# Altium footprint library Capacitors.PcbLib: 93 footprints (part 5 of 6)
Each footprint in its own frame and in the unit in brackets; x right, y up, seen from the top. Pads: shape width x height; smd on the part's side, far side on the other; paste and mask are expansions set on the pad; w line width, h text height; cw(c..) or ccw(c..) is an arc to the next point about the centre after c.
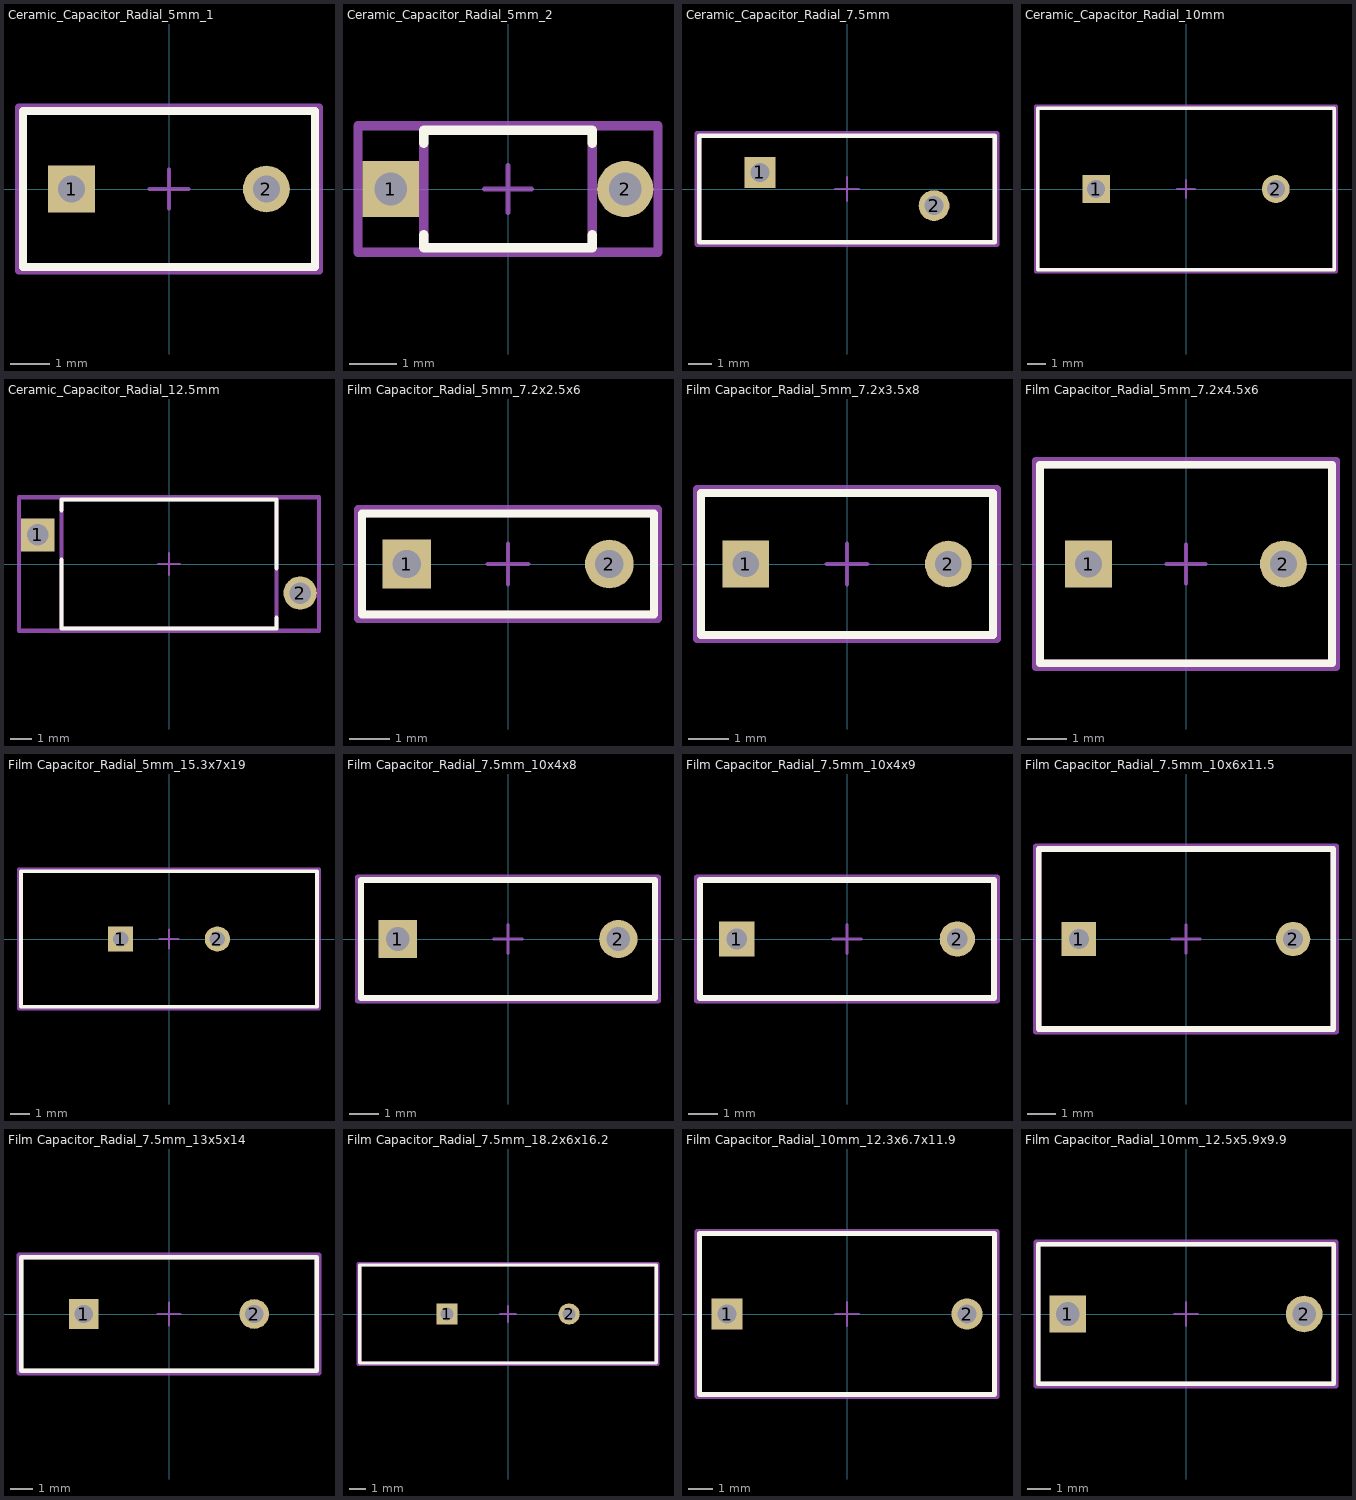
[diagram p4: the footprints below, top view; thin cyan lines are the x and y axes]

## Ceramic_Capacitor_Radial_5mm_1 [mm]
pads (2):
  rect 1.2x1.2 hole 0.7 paste-2539.97 mask+0: 1(-2.5,0)
  round 1.2 hole 0.7 paste-2539.97 mask+0: 2(2.5,0)
Top Overlay:
  lines w0.2: -3.75,-2 3.75,-2 3.75,2 -3.75,2 -3.75,-2
Top Assembly:
  lines w0.2: -3.85,-2.1 3.85,-2.1 3.85,2.1 -3.85,2.1 -3.85,-2.1
Top 3D Body:
  lines w0.2: -3.75,-2 3.75,-2 3.75,2 -3.75,2 -3.75,-2
Top Courtyard:
  lines w0.2: -3.85,-2.1 3.85,-2.1 3.85,2.1 -3.85,2.1 -3.85,-2.1
Top Component Center:
  lines w0.1: -0.5,0 0.5,0 ; 0,-0.5 0,0.5
3D body "Cap_Murata_RDE7U2J333J5B1H03B_eec.STEP": height 0.25, standoff 0, extent -3.85,-2.1 3.85,2.1

## Ceramic_Capacitor_Radial_5mm_2 [mm]
pads (2):
  rect 1.2x1.2 hole 0.7 paste-2539.97 mask+0: 1(-2.5,0)
  round 1.2 hole 0.7 paste-2539.97 mask+0: 2(2.5,0)
Top Overlay:
  lines w0.2: -1.8,-0.975 -1.8,-1.25 1.8,-1.25 1.8,-0.975 ; -1.8,0.975 -1.8,1.25 1.8,1.25 1.8,0.975
Top Assembly:
  lines w0.2: -3.2,-1.35 3.2,-1.35 3.2,1.35 -3.2,1.35 -3.2,-1.35
Top 3D Body:
  lines w0.2: -1.8,-1.25 1.8,-1.25 1.8,1.25 -1.8,1.25 -1.8,-1.25
Top Courtyard:
  lines w0.2: -3.2,-1.35 3.2,-1.35 3.2,1.35 -3.2,1.35 -3.2,-1.35
Top Component Center:
  lines w0.1: -0.5,0 0.5,0 ; 0,-0.5 0,0.5
3D body "Cap_Murata_RCE5C2A3R0C0K1H03B_eec.STEP": height 0.25, standoff 0, extent -3.2,-1.35 3.2,1.35

## Ceramic_Capacitor_Radial_7.5mm [mm]
pads (2):
  rect 1.3x1.3 hole 0.8 paste-2539.97 mask+0: 1(-3.684,0.7)
  round 1.3 hole 0.8 paste-2539.97 mask+0: 2(3.684,-0.7)
Top Overlay:
  lines w0.2: -6.25,-2.25 -6.25,2.25 6.25,2.25 6.25,-2.25 -6.25,-2.25
Top Assembly:
  lines w0.2: -6.35,-2.35 -6.35,2.35 6.35,2.35 6.35,-2.35 -6.35,-2.35
Top 3D Body:
  lines w0.2: -6.25,-2.25 -6.25,2.25 6.25,2.25 6.25,-2.25 -6.25,-2.25
Top Courtyard:
  lines w0.2: -6.35,-2.35 -6.35,2.35 6.35,2.35 6.35,-2.35 -6.35,-2.35
Top Component Center:
  lines w0.1: -0.5,0 0.5,0 ; 0,-0.5 0,0.5
3D body "Cap_Vishay_WYO472MCMCF0KR_eec.STEP": height 0.25, standoff 0, extent -6.35,-2.35 6.35,2.35

## Ceramic_Capacitor_Radial_10mm [mm]
pads (2):
  rect 1.55x1.55 hole 1 paste-2539.97 mask+0: 1(-5,0)
  round 1.55 hole 1 paste-2539.97 mask+0: 2(5,0)
Top Overlay:
  lines w0.2: -8.25,-4.5 8.25,-4.5 8.25,4.5 -8.25,4.5 -8.25,-4.5
Top Assembly:
  lines w0.2: -8.35,-4.6 8.35,-4.6 8.35,4.6 -8.35,4.6 -8.35,-4.6
Top 3D Body:
  lines w0.2: -8.25,-4.5 8.25,-4.5 8.25,4.5 -8.25,4.5 -8.25,-4.5
Top Courtyard:
  lines w0.2: -8.35,-4.6 8.35,-4.6 8.35,4.6 -8.35,4.6 -8.35,-4.6
Top Component Center:
  lines w0.1: -0.5,0 0.5,0 ; 0,-0.5 0,0.5
3D body "Cap_Panasonic_ECKD4A102MDU_eec.STEP": height 0.25, standoff 0, extent -8.35,-4.6 8.35,4.6

## Ceramic_Capacitor_Radial_12.5mm [mm]
pads (2):
  rect 1.55x1.55 hole 1 paste-2539.97 mask+0: 1(-6.102,1.35)
  round 1.55 hole 1 paste-2539.97 mask+0: 2(6.102,-1.35)
Top Overlay:
  lines w0.2: -5,0.2 -5,-3 5,-3 5,-2.5 ; -5,2.5 -5,3 5,3 5,-0.2
Top Assembly:
  lines w0.2: -6.977,-3.1 6.977,-3.1 6.977,3.1 -6.977,3.1 -6.977,-3.1
Top 3D Body:
  lines w0.2: -5,-3 5,-3 5,3 -5,3 -5,-3
Top Courtyard:
  lines w0.2: -6.977,-3.1 6.977,-3.1 6.977,3.1 -6.977,3.1 -6.977,-3.1
Top Component Center:
  lines w0.1: -0.5,0 0.5,0 ; 0,-0.5 0,0.5
3D body "Cap_Vishay_WKP102MCPEJ0KR_eec.STEP": height 0.25, standoff 0, extent -6.977,-3.1 6.977,3.1

## Film Capacitor_Radial_5mm_7.2x2.5x6 [mm]
pads (2):
  rect 1.2x1.2 hole 0.7 paste-2539.97 mask+0: 1(-2.5,0)
  round 1.2 hole 0.7 paste-2539.97 mask+0: 2(2.5,0)
Top Overlay:
  lines w0.2: -3.6,-1.25 3.6,-1.25 3.6,1.25 -3.6,1.25 -3.6,-1.25
Top Assembly:
  lines w0.2: -3.7,-1.35 3.7,-1.35 3.7,1.35 -3.7,1.35 -3.7,-1.35
Top 3D Body:
  lines w0.2: -3.6,-1.25 3.6,-1.25 3.6,1.25 -3.6,1.25 -3.6,-1.25
Top Courtyard:
  lines w0.2: -3.7,-1.35 3.7,-1.35 3.7,1.35 -3.7,1.35 -3.7,-1.35
Top Component Center:
  lines w0.1: -0.5,0 0.5,0 ; 0,-0.5 0,0.5
3D body "Cap_Vishay_BFC247066332_eec.STEP": height 0.25, standoff 0, extent -3.7,-1.35 3.7,1.35

## Film Capacitor_Radial_5mm_7.2x3.5x8 [mm]
pads (2):
  rect 1.15x1.15 hole 0.65 paste-2539.97 mask+0: 1(-2.5,0)
  round 1.15 hole 0.65 paste-2539.97 mask+0: 2(2.5,0)
Top Overlay:
  lines w0.2: -3.6,-1.75 3.6,-1.75 3.6,1.75 -3.6,1.75 -3.6,-1.75
Top Assembly:
  lines w0.2: -3.7,-1.85 3.7,-1.85 3.7,1.85 -3.7,1.85 -3.7,-1.85
Top 3D Body:
  lines w0.2: -3.6,-1.75 3.6,-1.75 3.6,1.75 -3.6,1.75 -3.6,-1.75
Top Courtyard:
  lines w0.2: -3.7,-1.85 3.7,-1.85 3.7,1.85 -3.7,1.85 -3.7,-1.85
Top Component Center:
  lines w0.1: -0.5,0 0.5,0 ; 0,-0.5 0,0.5
3D body "Cap_KEMET_MMK5105K50J02L4BULK_eec.STEP": height 0.25, standoff 0, extent -3.7,-1.85 3.7,1.85

## Film Capacitor_Radial_5mm_7.2x4.5x6 [mm]
pads (2):
  rect 1.2x1.2 hole 0.7 paste-2539.97 mask+0: 1(-2.5,0)
  round 1.2 hole 0.7 paste-2539.97 mask+0: 2(2.5,0)
Top Overlay:
  lines w0.2: -3.75,-2.55 3.75,-2.55 3.75,2.55 -3.75,2.55 -3.75,-2.55
Top Assembly:
  lines w0.2: -3.85,-2.65 3.85,-2.65 3.85,2.65 -3.85,2.65 -3.85,-2.65
Top 3D Body:
  lines w0.2: -3.75,-2.55 3.75,-2.55 3.75,2.55 -3.75,2.55 -3.75,-2.55
Top Courtyard:
  lines w0.2: -3.85,-2.65 3.85,-2.65 3.85,2.65 -3.85,2.65 -3.85,-2.65
Top Component Center:
  lines w0.1: -0.5,0 0.5,0 ; 0,-0.5 0,0.5
3D body "Cap_Kemet_R82DC4100DQ60J_eec.STEP": height 0.25, standoff 0, extent -3.85,-2.65 3.85,2.65

## Film Capacitor_Radial_5mm_15.3x7x19 [mm]
pads (2):
  rect 1.3x1.3 hole 0.8 paste-2539.97 mask+0: 1(-2.5,0)
  round 1.3 hole 0.8 paste-2539.97 mask+0: 2(2.5,0)
Top Overlay:
  lines w0.2: -7.65,-3.5 -7.65,3.5 7.65,3.5 7.65,-3.5 -7.65,-3.5
Top Assembly:
  lines w0.2: -7.75,-3.6 -7.75,3.6 7.75,3.6 7.75,-3.6 -7.75,-3.6
Top 3D Body:
  lines w0.2: -7.65,-3.5 -7.65,3.5 7.65,3.5 7.65,-3.5 -7.65,-3.5
Top Courtyard:
  lines w0.2: -7.75,-3.6 -7.75,3.6 7.75,3.6 7.75,-3.6 -7.75,-3.6
Top Component Center:
  lines w0.1: -0.5,0 0.5,0 ; 0,-0.5 0,0.5
3D body "Cap_Panasonic_Electronic_Components_ECQ-E2105JBB_eec.STEP": height 0.25, standoff 0, extent -7.75,-3.6 7.75,3.6

## Film Capacitor_Radial_7.5mm_10x4x8 [mm]
pads (2):
  rect 1.3x1.3 hole 0.8 paste-2539.97 mask+0: 1(-3.75,0)
  round 1.3 hole 0.8 paste-2539.97 mask+0: 2(3.75,0)
Top Overlay:
  lines w0.2: -5,-2 -5,2 5,2 5,-2 -5,-2
Top Assembly:
  lines w0.2: -5.1,-2.1 -5.1,2.1 5.1,2.1 5.1,-2.1 -5.1,-2.1
Top 3D Body:
  lines w0.2: -5,-2 -5,2 5,2 5,-2 -5,-2
Top Courtyard:
  lines w0.2: -5.1,-2.1 -5.1,2.1 5.1,2.1 5.1,-2.1 -5.1,-2.1
Top Component Center:
  lines w0.1: -0.5,0 0.5,0 ; 0,-0.5 0,0.5
3D body "Cap_KEMET_PHE450HK5180FR05_eec.STEP": height 0.25, standoff 0, extent -5.1,-2.1 5.1,2.1

## Film Capacitor_Radial_7.5mm_10x4x9 [mm]
pads (2):
  rect 1.2x1.2 hole 0.7 paste-2539.97 mask+0: 1(-3.75,0)
  round 1.2 hole 0.7 paste-2539.97 mask+0: 2(3.75,0)
Top Overlay:
  lines w0.2: -5,-2 5,-2 5,2 -5,2 -5,-2
Top Assembly:
  lines w0.2: -5.1,-2.1 5.1,-2.1 5.1,2.1 -5.1,2.1 -5.1,-2.1
Top 3D Body:
  lines w0.2: -5,-2 5,-2 5,2 -5,2 -5,-2
Top Courtyard:
  lines w0.2: -5.1,-2.1 5.1,-2.1 5.1,2.1 -5.1,2.1 -5.1,-2.1
Top Component Center:
  lines w0.1: -0.5,0 0.5,0 ; 0,-0.5 0,0.5
3D body "Cap_Vishay_BC_Components_BFC233860102_eec.STEP": height 0.25, standoff 0, extent -5.1,-2.1 5.1,2.1

## Film Capacitor_Radial_7.5mm_10x6x11.5 [mm]
pads (2):
  rect 1.2x1.2 hole 0.7 paste-2539.97 mask+0: 1(-3.75,0)
  round 1.2 hole 0.7 paste-2539.97 mask+0: 2(3.75,0)
Top Overlay:
  lines w0.2: -5.15,-3.15 5.15,-3.15 5.15,3.15 -5.15,3.15 -5.15,-3.15
Top Assembly:
  lines w0.2: -5.25,-3.25 5.25,-3.25 5.25,3.25 -5.25,3.25 -5.25,-3.25
Top 3D Body:
  lines w0.2: -5.15,-3.15 5.15,-3.15 5.15,3.15 -5.15,3.15 -5.15,-3.15
Top Courtyard:
  lines w0.2: -5.25,-3.25 5.25,-3.25 5.25,3.25 -5.25,3.25 -5.25,-3.25
Top Component Center:
  lines w0.1: -0.5,0 0.5,0 ; 0,-0.5 0,0.5
3D body "Cap_Vishay_BC_Components_BFC233860472_eec.STEP": height 0.25, standoff 0, extent -5.25,-3.25 5.25,3.25

## Film Capacitor_Radial_7.5mm_13x5x14 [mm]
pads (2):
  rect 1.3x1.3 hole 0.8 paste-2539.97 mask+0: 1(-3.75,0)
  round 1.3 hole 0.8 paste-2539.97 mask+0: 2(3.75,0)
Top Overlay:
  lines w0.2: -6.5,-2.5 6.5,-2.5 6.5,2.5 -6.5,2.5 -6.5,-2.5
Top Assembly:
  lines w0.2: -6.6,-2.6 6.6,-2.6 6.6,2.6 -6.6,2.6 -6.6,-2.6
Top 3D Body:
  lines w0.2: -6.5,-2.5 6.5,-2.5 6.5,2.5 -6.5,2.5 -6.5,-2.5
Top Courtyard:
  lines w0.2: -6.6,-2.6 6.6,-2.6 6.6,2.6 -6.6,2.6 -6.6,-2.6
Top Component Center:
  lines w0.1: -0.5,0 0.5,0 ; 0,-0.5 0,0.5
3D body "Cap_Panasonic_Electronic_Components_ECW-F2104JAB_eec.STEP": height 0.25, standoff 0, extent -6.6,-2.6 6.6,2.6

## Film Capacitor_Radial_7.5mm_18.2x6x16.2 [mm]
pads (2):
  rect 1.3x1.3 hole 0.8 paste-2539.97 mask+0: 1(-3.75,0)
  round 1.3 hole 0.8 paste-2539.97 mask+0: 2(3.75,0)
Top Overlay:
  lines w0.2: -9.1,-3 9.1,-3 9.1,3 -9.1,3 -9.1,-3
Top Assembly:
  lines w0.2: -9.2,-3.1 9.2,-3.1 9.2,3.1 -9.2,3.1 -9.2,-3.1
Top 3D Body:
  lines w0.2: -9.1,-3 9.1,-3 9.1,3 -9.1,3 -9.1,-3
Top Courtyard:
  lines w0.2: -9.2,-3.1 9.2,-3.1 9.2,3.1 -9.2,3.1 -9.2,-3.1
Top Component Center:
  lines w0.1: -0.5,0 0.5,0 ; 0,-0.5 0,0.5
3D body "Cap_Panasonic_Electronic_Components_ECW-FA2J154JB_eec.STEP": height 0.25, standoff 0, extent -9.2,-3.1 9.2,3.1

## Film Capacitor_Radial_10mm_12.3x6.7x11.9 [mm]
pads (2):
  rect 1.3x1.3 hole 0.8 paste-2539.97 mask+0: 1(-5,0)
  round 1.3 hole 0.8 paste-2539.97 mask+0: 2(5,0)
Top Overlay:
  lines w0.2: -6.15,-3.35 -6.15,3.35 6.15,3.35 6.15,-3.35 -6.15,-3.35
Top Assembly:
  lines w0.2: -6.25,-3.45 -6.25,3.45 6.25,3.45 6.25,-3.45 -6.25,-3.45
Top 3D Body:
  lines w0.2: -6.15,-3.35 -6.15,3.35 6.15,3.35 6.15,-3.35 -6.15,-3.35
Top Courtyard:
  lines w0.2: -6.25,-3.45 -6.25,3.45 6.25,3.45 6.25,-3.45 -6.25,-3.45
Top Component Center:
  lines w0.1: -0.5,0 0.5,0 ; 0,-0.5 0,0.5
3D body "Cap_Panasonic_Electronic_Components_ECQ-E2564KB_eec.STEP": height 0.25, standoff 0, extent -6.25,-3.45 6.25,3.45

## Film Capacitor_Radial_10mm_12.5x5.9x9.9 [mm]
pads (2):
  rect 1.55x1.55 hole 1 paste-2539.97 mask+0: 1(-5,0)
  round 1.55 hole 1 paste-2539.97 mask+0: 2(5,0)
Top Overlay:
  lines w0.2: -6.25,-2.95 -6.25,2.95 6.25,2.95 6.25,-2.95 -6.25,-2.95
Top Assembly:
  lines w0.2: -6.35,-3.05 -6.35,3.05 6.35,3.05 6.35,-3.05 -6.35,-3.05
Top 3D Body:
  lines w0.2: -6.25,-2.95 -6.25,2.95 6.25,2.95 6.25,-2.95 -6.25,-2.95
Top Courtyard:
  lines w0.2: -6.35,-3.05 -6.35,3.05 6.35,3.05 6.35,-3.05 -6.35,-3.05
Top Component Center:
  lines w0.1: -0.5,0 0.5,0 ; 0,-0.5 0,0.5
3D body "Cap_Vishay_BFC236966223_eec.STEP": height 0.25, standoff 0, extent -6.35,-3.05 6.35,3.05